# Altium footprint library PCB_MPPT.PcbLib: 48 footprints (part 3 of 3)
Each footprint in its own frame and in the unit in brackets; x right, y up, seen from the top. Pads: shape width x height; smd on the part's side, far side on the other; paste and mask are expansions set on the pad; w line width, h text height; cw(c..) or ccw(c..) is an arc to the next point about the centre after c.
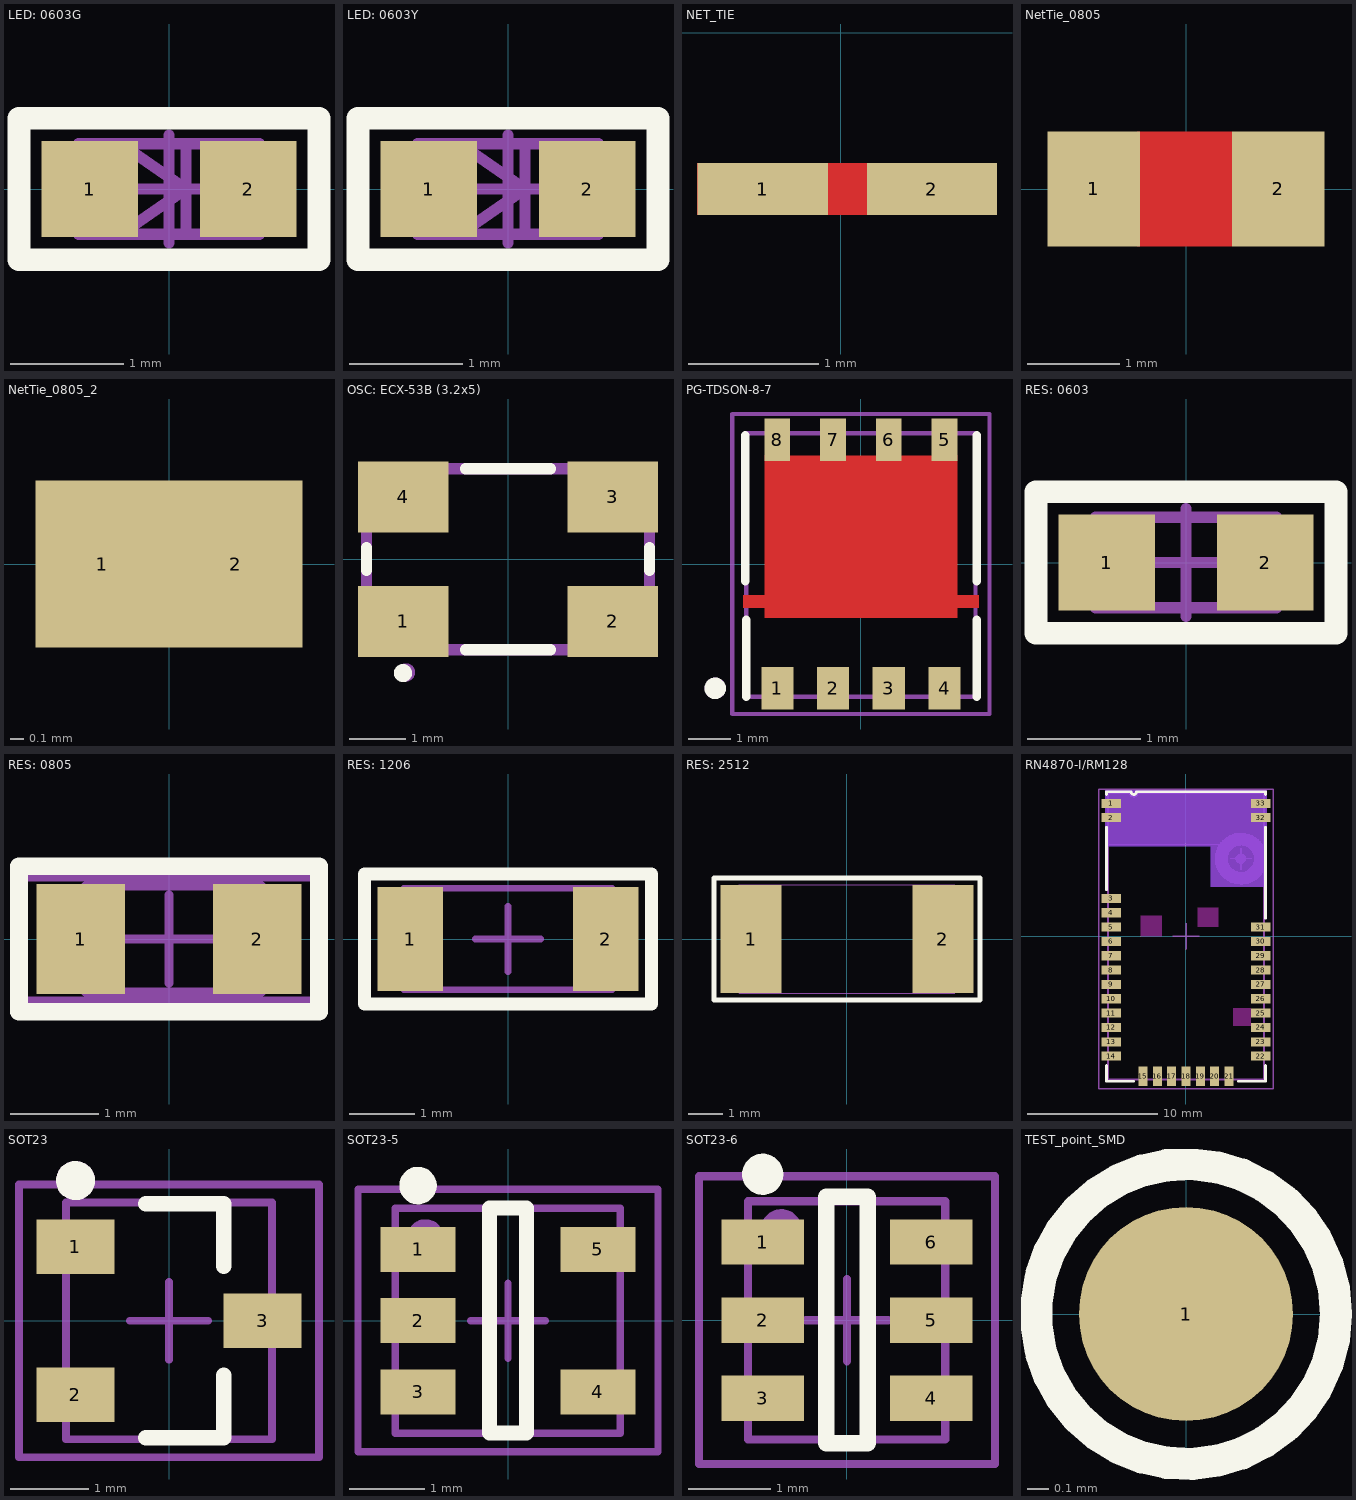
[diagram p2: the footprints below, top view; thin cyan lines are the x and y axes]

## LED: 0603G [mm]
height 0.45
pads (2):
  rect 0.85x0.85 smd: 1(-0.7,0) 2(0.7,0)
Top Overlay:
  lines w0.2: -1.325,-0.625 -1.325,0.625 1.325,0.625 1.325,-0.625 -1.325,-0.625
Top Assy:
  lines w0.1: 0.15,-0.4 0.15,0.4 ; -0.8,-0.4 -0.8,0.4 0.8,0.4 0.8,-0.4 -0.8,-0.4 ; -0.425,-0.4 -0.425,0.4 0.15,0 -0.425,-0.4
Mechanical 15:
  lines w0.1: -0.475,0 0.475,0 ; 0,-0.475 0,0.475 ; -1.325,-0.625 -1.325,0.6 1.325,0.6 1.325,-0.625 -1.325,-0.625
3D body "User Library-LED_0603_G.STEP": height 0.6, standoff 0, extent -0.8,-0.4 0.8,0.4

## LED: 0603Y [mm]
height 0.45
pads (2):
  rect 0.85x0.85 smd: 1(-0.7,0) 2(0.7,0)
Top Overlay:
  lines w0.2: -1.325,-0.625 1.325,-0.625 1.325,0.625 -1.325,0.625 -1.325,-0.625
Top Assy:
  lines w0.1: 0.15,-0.4 0.15,0.4 ; -0.8,-0.4 0.8,-0.4 0.8,0.4 -0.8,0.4 -0.8,-0.4 ; -0.425,-0.4 -0.425,0.4 0.15,0 -0.425,-0.4
Mechanical 15:
  lines w0.1: -0.475,0 0.475,0 ; 0,-0.475 0,0.475 ; -1.325,-0.625 1.325,-0.625 1.325,0.6 -1.325,0.6 -1.325,-0.625
3D body "User Library-LED_0603_Y.STEP": height 0.6, standoff 0, extent -0.8,-0.4 0.8,0.4

## NET_TIE [mm] "NETTIE"
pads (2):
  rect 1x0.4 smd: 1(-0.6,-1.2) 2(0.7,-1.2)
Top Layer:
  rectangle: -1.105,-1.4 1.195,-1

## NetTie_0805 [mm]
pads (2):
  rect 1x1.25 smd: 1(-1,0) 2(1,0)
Top Layer:
  rectangle: -0.525,-0.625 0.5,0.625

## NetTie_0805_2 [mm]
pads (2):
  rect 1x1.25 smd: 1(-0.5,0) 2(0.5,0)

## OSC: ECX-53B (3.2x5) [mm] "ECX-53B"
pads (4):
  rect 1.6x1.25 smd: 1(-1.85,-1.1) 2(1.85,-1.1) 3(1.85,1.1) 4(-1.85,1.1)
Top Overlay:
  circle w0.2: c-1.856,-2.012 r0.059
  lines w0.2: -2.5,-0.2 -2.5,0.2 ; -0.75,-1.6 0.75,-1.6 ; -0.75,1.6 0.75,1.6 ; 2.5,-0.2 2.5,0.2
Top Assy:
  circle w0.2: c-1.8,-2 r0.059
  lines w0.2: -2.5,-1.6 2.5,-1.6 2.5,1.6 -2.5,1.6 -2.5,-1.6
3D body "XTAL_ecx-53b.step": height 0.85, standoff 0, extent -2.5,-1.6 2.5,1.6

## PG-TDSON-8-7 [mm] "pitch 1.3 mm, power pad; Infenion"
height 1
pads (9):
  rect 0.75x1 smd: 1(-1.95,-2.9) 2(-0.65,-2.9) 3(0.65,-2.9) 4(1.95,-2.9)
  rect 0.6x1 smd: 5(1.95,2.9) 6(0.65,2.9) 7(-0.65,2.9) 8(-1.95,2.9)
  round 0.5 on Mech1: ""(-3.4,-2.9)
Top Layer:
  region: -2.75,-1.025 -2.25,-1.025 -2.25,-1.25 2.25,-1.25 2.25,-1.025 2.75,-1.025 2.75,-0.725 -2.75,-0.725
  region: -2.25,2.525 -1.65,2.525 -0.95,2.525 -0.35,2.525 0.35,2.525 0.95,2.525 1.65,2.525 2.25,2.525 2.25,-0.725 2.75,-0.725 2.75,-1.025 -2.75,-1.025 -2.75,-0.725 -2.25,-0.725
Top Overlay:
  circle w0.25: c-3.4,-2.9 r0.125
  lines w0.2: -2.7,-0.4 -2.7,3 ; -2.675,-3.1 -2.675,-1.3 ; 2.7,-3.1 2.7,-1.3 ; 2.7,-0.4 2.7,3
Top Paste:
  rectangle: -2.25,-1.25 2.25,2.525
  rectangle: 2.25,-1.025 2.75,-0.725
  rectangle: -2.75,-1.025 -2.25,-0.725
Top Solder:
  region: -2.35,2.625 -2.35,-0.625 -2.85,-0.625 -2.85,-1.125 -2.35,-1.125 -2.35,-1.35 2.35,-1.35 2.35,-1.125 2.85,-1.125 2.85,-0.625 2.35,-0.625 2.35,2.625
Top Assy:
  lines w0.1: -2.675,-3.1 2.675,-3.1 2.675,3.05 -2.675,3.05 -2.675,-3.1
Mechanical 15:
  lines w0.1: -0.2,0 0.2,0 ; 0,-0.2 0,0.2 ; -3,-3.5 2.9,-3.5 3,-3.5 3,3.5 -3,3.5 -3,-3.5
3D body "User Library-TDSON-8-1.STEP": height 1.03, standoff 0.03, extent -2.675,-3.1 2.675,3.05

## RES: 0603 [mm]
height 0.45
pads (2):
  rect 0.85x0.85 smd: 1(-0.7,0) 2(0.7,0)
Top Overlay:
  lines w0.2: -1.325,-0.625 -1.325,0.625 1.325,0.625 1.325,-0.625 -1.325,-0.625
Top Assy:
  lines w0.1: -0.8,-0.4 -0.8,0.4 0.8,0.4 0.8,-0.4 -0.8,-0.4
Mechanical 15:
  lines w0.1: -0.475,0 0.475,0 ; 0,-0.475 0,0.475 ; -1.325,-0.65 1.325,-0.65 1.325,0.625 -1.325,0.625 -1.325,-0.65
3D body "chip_0603_r.STEP": height 0.44, standoff -0.02, extent -0.8,-0.4 0.8,0.4

## RES: 0805 [mm]
height 0.45
pads (2):
  rect 1x1.25 smd: 1(-1,0) 2(1,0)
Top Overlay:
  lines w0.2: -1.7,-0.825 -1.7,0.825 1.7,0.825 1.7,-0.825 -1.7,-0.825
Top Assy:
  lines w0.1: -0.949,-0.6 -0.949,0.6 1.05,0.6 1.05,-0.6 -0.949,-0.6
Mechanical 15:
  lines w0.1: -0.5,0 0.5,0 ; 0,-0.5 0,0.5 ; -1.675,-0.7 1.675,-0.7 1.675,0.7 -1.675,0.7 -1.675,-0.7
3D body "chip_0805_r.STEP": height 0.44, standoff -0.02, extent -1,-0.6 1,0.6

## RES: 1206 [mm]
height 0.6
pads (2):
  rect 1x1.6 smd: 1(-1.5,0) 2(1.5,0)
Top Overlay:
  lines w0.2: -2.2,-1 2.2,-1 2.2,1 -2.2,1 -2.2,-1
Top Assy:
  lines w0.1: -1.6,-0.775 1.6,-0.775 1.6,0.775 -1.6,0.775 -1.6,-0.775
Mechanical 15:
  lines w0.1: -0.5,0 0.5,0 ; 0,-0.5 0,0.5 ; -2.2,-1 -2.2,1 2.2,1 2.2,-1 -2.2,-1
3D body "chip_1206_r.STEP": height 0.47, standoff -0.03, extent -1.65,-0.8 1.55,0.8

## RES: 2512 [mm]
height 0.55
pads (2):
  rect 1.8x3.2 smd mask+0.1: 1(-2.825,0) 2(2.825,0)
Top Overlay:
  lines w0.15: -3.925,-1.8 3.925,-1.8 3.925,1.8 -3.925,1.8 -3.925,-1.8
Top Assy:
  lines w0.01: -3.175,-1.6 3.175,-1.6 3.175,1.6 -3.175,1.6 -3.175,-1.6
3D body "SMD R-2512.STEP": height 0.62, standoff 0, extent -3.16,-1.6 3.16,1.6

## RN4870-I/RM128 [mm] "bluetooth module"
height 2.4
pads (33):
  rect 1.5x0.7 smd: 1(-5.742,10.2) 2(-5.742,9.1) 3(-5.75,2.9) 4(-5.75,1.8) 5(-5.75,0.7) 6(-5.75,-0.4) 7(-5.75,-1.5) 8(-5.75,-2.6) 9(-5.75,-3.7) 10(-5.75,-4.8) 11(-5.75,-5.9) 12(-5.75,-7) 13(-5.75,-8.1) 14(-5.75,-9.2) 22(5.75,-9.2) 23(5.75,-8.1) 24(5.75,-7) 25(5.75,-5.9) 26(5.75,-4.8) 27(5.75,-3.7) 28(5.75,-2.6) 29(5.75,-1.5) 30(5.75,-0.4) 31(5.75,0.7) 32(5.75,9.1) 33(5.75,10.2)
  rect 0.7x1.5 smd: 15(-3.3,-10.75) 16(-2.2,-10.75) 17(-1.1,-10.75) 18(0,-10.75) 19(1.1,-10.75) 20(2.2,-10.75) 21(3.3,-10.75)
Top Layer keep-out:
  rectangle: 3.6,-6.9 5,-5.5
  rectangle: 0.9,0.7 2.5,2.2
  rectangle: -3.5,0 -1.85,1.6
  region: -6.2,11.2 6.2,11.2 6.2,3.8 1.9,3.8 1.9,6.9 -6.2,6.9
Bottom Layer keep-out:
  region: -6.2,11.2 6.2,11.2 6.2,3.8 1.9,3.8 1.9,6.9 -6.2,6.9
Top Overlay:
  lines w0.2: -6.1,-9.921 -6.1,-11.121 -4,-11.121 ; -6.1,3.579 -6.1,8.379 ; -6.1,10.879 -6.1,11.079 -4.2,11.079 ccw(c-4,11.079) -4,10.879 ccw(c-4,11.079) -3.8,11.079 6.1,11.079 6.1,10.879 ; 4,-11.121 6.1,-11.121 6.1,-9.921 ; 6.1,1.379 6.1,8.379
Top Assy:
  lines w0.15: -6,7.05 6,7.05 ; -6,-11 6,-11 ; -6,-11 -6,11 -4.3,11 ccw(c-4,11) -3.7,11 6,11 6,-11 ; -6,-11 6,-11
Mechanical 11:
  lines w0.127: -6,-11 6,-11 ; -6,-11 -6,11 -4.3,11 ccw(c-4,11) -3.7,11 6,11 6,-11 ; -6,-11 6,-11
  lines w0.152: -6,7.05 6,7.05 ; 3.41,5.95 4.21,5.95 ; 4.21,5.15 4.21,5.95 ; 4.21,6.75 4.21,5.95 ; 5.01,5.95 4.21,5.95
  lines w0.4: 4.359,6.083 ccw(c4.21,5.95) 4.378,6.058
  lines w1: 5.71,5.948 cw(c4.21,5.95) 5.71,5.948
Mechanical 15:
  lines w0.1: -1,0 1,0 ; 0,-1 0,1 ; -6.7,-11.721 -6.7,11.279 6.7,11.279 6.7,-11.721 -6.7,-11.721
3D body: height 1.8, standoff 0.6, extent -1.5,9.1 2,10.6
3D body: height 0.6, standoff 0, extent -6,-11 6,11
3D body: height 2.4, standoff 0.6, extent -5.2,-9.6 5.2,7

## SOT23 [mm]
height 1.1
pads (3):
  rect 1x0.7 smd: 1(-1.2,0.95) 2(-1.2,-0.95) 3(1.2,0)
Top Overlay:
  circle w0.25: c-1.2,1.8 r0.125
  lines w0.2: -0.3,-1.5 0.7,-1.5 0.7,-0.7 ; -0.3,1.5 0.7,1.5 0.7,0.7
Top Assy:
  circle w0.25: c-1.2,1.8 r0.125
  lines w0.1: -1.32,-1.52 -1.32,1.52 1.32,1.52 1.32,-1.52 -1.32,-1.52
Mechanical 15:
  lines w0.1: -0.5,0 0.5,0 ; 0,-0.5 0,0.5 ; -1.925,-1.75 1.925,-1.75 1.925,1.75 -1.925,1.75 -1.925,-1.75
3D body "SOT95P237X112-3N.step": height 1.12, standoff 0, extent -1.32,-1.52 1.32,1.52

## SOT23-5 [mm] "pitch 0.95 mm"
height 1.45
pads (5):
  rect 1x0.6 smd: 1(-1.2,0.95) 2(-1.2,0) 3(-1.2,-0.95) 4(1.2,-0.95) 5(1.2,0.95)
Top Overlay:
  circle w0.25: c-1.2,1.8 r0.125
  lines w0.2: -0.25,-1.5 -0.25,1.5 0.25,1.5 0.25,-1.5 -0.25,-1.5
Top Assy:
  circle w0.25: c-1.1,1.1 r0.125
  lines w0.1: -1.5,-1.5 1.5,-1.5 1.5,1.5 -1.5,1.5 -1.5,-1.5
Mechanical 15:
  lines w0.1: -0.5,0 0.5,0 ; 0,-0.5 0,0.5 ; -2,-1.75 2,-1.75 2,1.75 -2,1.75 -2,-1.75
3D body "SOT23-5-1.step": height 1.3, standoff 0, extent -1.5,-1.5 1.5,1.5

## SOT23-6 [mm] "pitch 0.95 mm"
height 1.1
pads (6):
  rect 1x0.55 smd: 1(-1.025,0.95) 2(-1.025,0) 3(-1.025,-0.95) 4(1.025,-0.95) 5(1.025,0) 6(1.025,0.95)
Top Overlay:
  circle w0.25: c-1.025,1.775 r0.125
  lines w0.2: -0.25,-1.5 -0.25,1.5 0.25,1.5 0.25,-1.5 -0.25,-1.5
Top Assy:
  circle w0.25: c-0.8,1.1 r0.125
  lines w0.1: -1.204,-1.453 1.196,-1.453 1.196,1.447 -1.204,1.447 -1.204,-1.453
Mechanical 15:
  lines w0.1: -0.5,0 0.5,0 ; 0,-0.5 0,0.5 ; -1.8,-1.75 1.8,-1.75 1.8,1.75 -1.8,1.75 -1.8,-1.75
3D body "User Library-SOT23-6-2.STEP": height 1.45, standoff 0, extent -1.4,-1.45 1.4,1.45

## TEST_point_SMD [mm] "контактная площадка"
pads (1):
  round 1 smd mask+0.1: 1(0,0)
Top Overlay:
  circle w0.15: c0,0 r0.7